# Altium footprint library mornsun_footprint.PcbLib: 11 footprints
Each footprint in its own frame and in the unit in brackets; x right, y up, seen from the top. Pads: shape width x height; smd on the part's side, far side on the other; paste and mask are expansions set on the pad; w line width, h text height; cw(c..) or ccw(c..) is an arc to the next point about the centre after c.
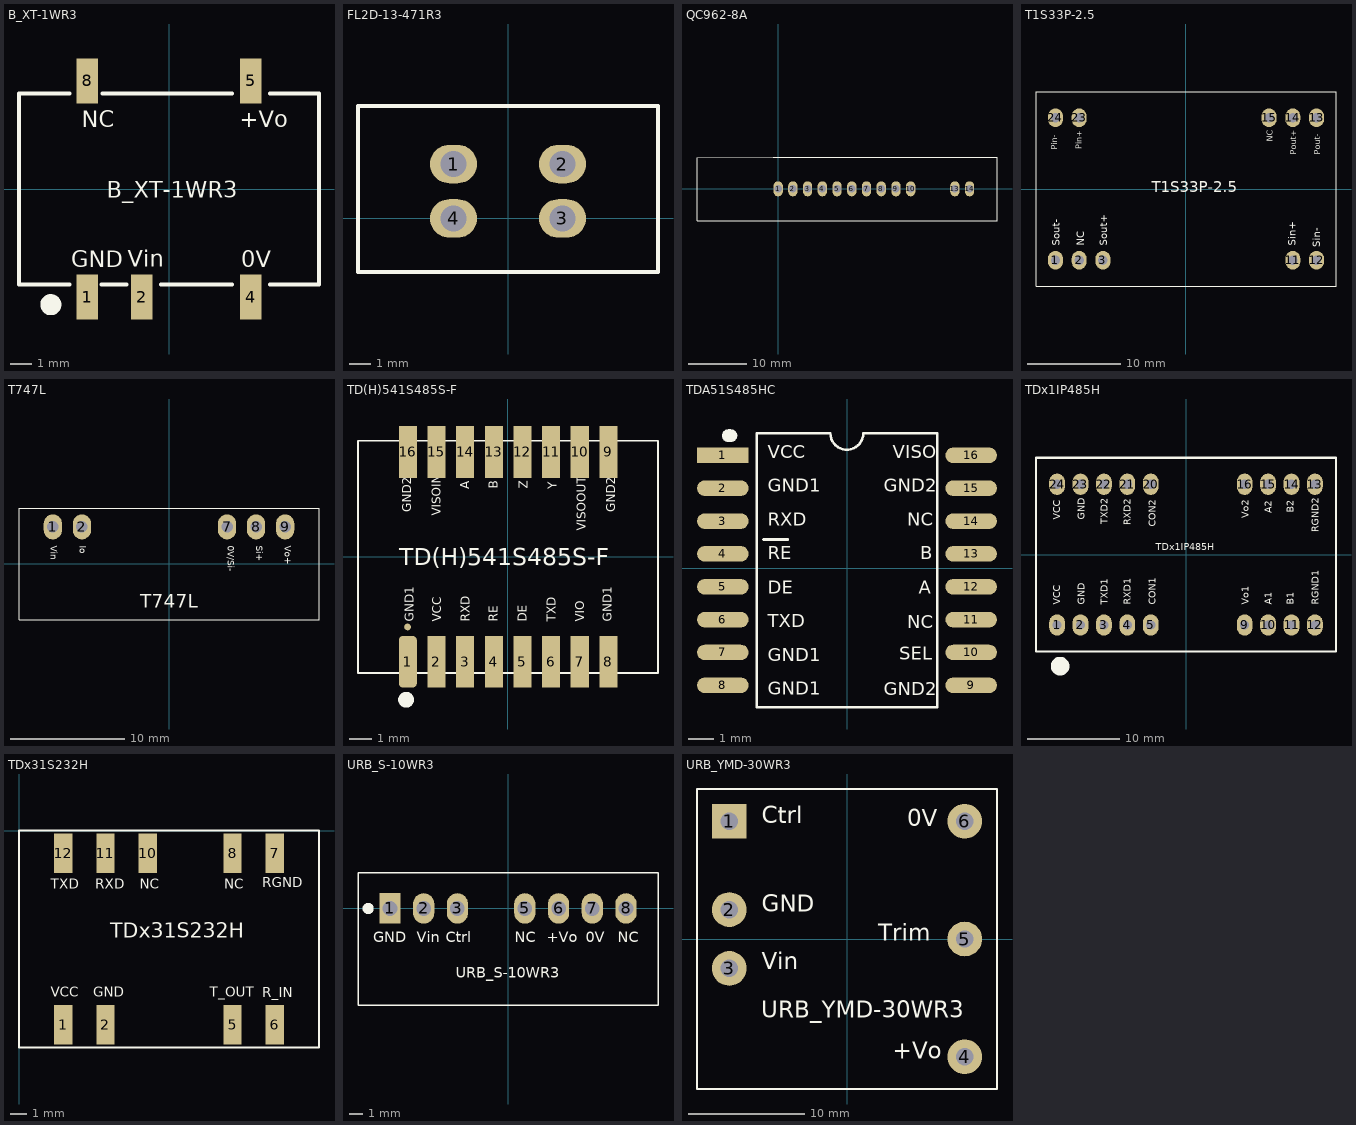
[diagram p0: the footprints below, top view; thin cyan lines are the x and y axes]

## B_XT-1WR3 [mm]
pads (5):
  rect 1x2.1 smd: 1(-3.81,-5.05) 2(-1.27,-5.05) 4(3.81,-5.05) 5(3.81,5.05) 8(-3.81,5.05)
Top Overlay:
  lines w0.178: -4.642,-4.45 -7,-4.45 -7,4.45 -4.642,4.45 ; -3.161,-4.45 -1.981,-4.45 ; -3.099,4.45 -0.38,4.45 2.949,4.45 ; -0.38,-4.45 2.949,-4.45 ; 4.705,-4.45 7,-4.45 7,4.45 4.705,4.45
  lines w0.508: -5.303,-5.295 ccw(c-5.515,-5.401) -5.279,-5.378
  text "B_XT-1WR3" at -2.902,-0.407 h0.76
  text "+Vo" at 3.302,2.878 h0.76
  text "Vin" at -1.925,-3.627 h0.76
  text "NC" at -4.064,2.878 h0.76
  text "GND" at -4.572,-3.646 h0.76
  text "0V" at 3.378,-3.646 h0.76
3D body "B-XT-1WR3.stp": height 7.2, standoff -0.05, extent -6.601,-5.629 6.599,5.771

## FL2D-13-471R3 [mm]
pads (4):
  oval 2.2x1.8 hole 1.2 unplated mask+0.25: 1(-2.54,2.54) 2(2.54,2.54) 3(2.54,0) 4(-2.54,0)
Top Overlay:
  lines w0.2: -7,-2.5 7,-2.5 7,5.25 -5,5.25 -7,5.25 -7,-1.5 -7,-2.5

## QC962-8A [mm]
height 25.5
pads (12):
  oval 1.6x2.6 hole 1.3 mask+0.07: 1(0,0) 2(2.54,0) 3(5.08,0) 4(7.62,0) 5(10.16,0) 6(12.7,0) 7(15.24,0) 8(17.78,0) 9(20.32,0) 10(22.86,0) 13(30.48,0) 14(33.02,0)
Top Overlay:
  lines w0.127: 37.75,5.4 37.75,-5.5 -14,-5.5 -14,5.4 -0.875,5.45 24.875,5.45 37.75,5.45
3D body "QC962-8A.stp": height 3.1, standoff -26, extent -13.6,-5.1 37.4,4.9

## T1S33P-2.5 [mm]
pads (10):
  oval 1.6x2 hole 1 mask+0.102: 1(-13.97,-7.62) 2(-11.43,-7.62) 3(-8.89,-7.62) 11(11.43,-7.62) 12(13.97,-7.62) 13(13.97,7.62) 14(11.43,7.62) 15(8.89,7.62) 23(-11.43,7.62) 24(-13.97,7.62)
Top Overlay:
  lines w0.076: -16.05,-10.4 16.05,-10.4 16.05,10.4 -16.05,10.4 -16.05,-10.4
  text "NC" at 9.286,5.042 h0.64
  text "Pin-" at -13.79,4.182 h0.64
  text "T1S33P-2.5" at -3.683,-0.762 h2
  text "Sin+" at 11.736,-6.067 h0.76
  text "Pout+" at 11.811,3.683 h0.64
  text "Pout-" at 14.351,3.683 h0.64
  text "Pin+" at -11.151,4.243 h0.64
  text "Sout-" at -13.533,-6.07 h0.76
  text "NC" at -10.898,-6.07 h0.76
  text "Sout+" at -8.453,-6.07 h0.76
  text "Sin-" at 14.382,-6.223 h0.76
3D body "TxxxxP.stp": height 9.5, standoff -4.1, extent -15.9,-10.16 15.9,10.14

## T747L [mm]
pads (5):
  oval 1.6x2.2 hole 1 mask+0.102: 1(-10.16,3.25) 2(-7.62,3.25) 7(5.08,3.25) 8(7.62,3.25) 9(10.16,3.25)
Top Overlay:
  lines w0.076: -13.125,-4.875 -13.125,4.875 13.125,4.875 13.125,-4.875 -13.125,-4.875
  text "Vo+" at 9.924,1.603 h1
  text "Si+" at 7.412,1.602 h1
  text "0V/Si-" at 4.9,1.605 h1
  text "Io" at -8.021,1.603 h1
  text "Vin" at -10.585,1.603 h1
  text "T747L" at -2.506,-4.221 h2
3D body "T_L.stp": height 13.01, standoff -3.59, extent -13,-4.699 13,4.801

## TD(H)541S485S-F [mm]
pads (17):
  rrect50% 0.8x2.3 smd mask+0: 1(-4.439,-4.65)
  round 0.3 smd mask+0: 2(-4.451,-3.107)
  rect 0.8x2.3 smd mask+0: 2(-3.169,-4.65) 3(-1.899,-4.65) 4(-0.629,-4.65) 5(0.641,-4.65) 6(1.911,-4.65) 7(3.181,-4.65) 8(4.451,-4.65) 9(4.451,4.65) 10(3.181,4.65) 11(1.911,4.65) 12(0.641,4.65) 13(-0.629,4.65) 14(-1.899,4.65) 15(-3.169,4.65) 16(-4.439,4.65)
Top Overlay:
  circle w0.5: c-4.519,-6.333 r0.098
  lines w0.076: -6.649,-5.15 6.651,-5.15 6.651,5.15 -6.649,5.15 -6.649,-5.15
  text "GND1" at 4.611,-2.88 h0.38
  text "VIO" at 3.377,-2.88 h0.38
  text "TXD" at 2.114,-2.88 h0.38
  text "DE" at 0.828,-2.88 h0.38
  text "RE" at -0.451,-2.88 h0.38
  text "RXD" at -1.7,-2.88 h0.38
  text "VCC" at -2.963,-2.88 h0.38
  text "GND1" at -4.181,-2.88 h0.38
  text "GND2" at 4.755,1.974 h0.38
  text "VISOOUT" at 3.453,1.156 h0.38
  text "Y" at 2.162,2.995 h0.38
  text "Z" at 0.878,3.031 h0.38
  text "B" at -0.45,3.031 h0.38
  text "A" at -1.709,2.995 h0.38
  text "VISOIN" at -2.97,1.814 h0.38
  text "GND2" at -4.28,1.974 h0.38
  text "TD(H)541S485S-F" at -4.824,-0.382 h0.76
3D body "TD541S485S-F.stp": height 3.1, standoff -0.02, extent -6.5,-5.005 6.5,5.005

## TDA51S485HC [mm]
pads (17):
  rect 2x0.6 smd: 1(-4.81,4.36)
  oval 2x0.6 smd: 2(-4.81,3.09) 3(-4.81,1.82) 4(-4.81,0.55) 5(-4.81,-0.72) 6(-4.81,-1.99) 7(-4.81,-3.26) 8(-4.81,-4.53) 9(4.79,-4.53) 10(4.79,-3.26) 11(4.79,-1.99) 12(4.79,-0.72) 13(4.79,0.55) 14(4.79,1.82) 15(4.79,3.09) 16(4.79,4.36)
  oval 0.6x0.5 on Top Overlay mask+0.051: ""(-4.55,5.122)
Top Overlay:
  lines w0.1: -3.497,-5.385 3.477,-5.385 3.477,5.215 0.62,5.215 cw(c-0.015,5.215) -0.65,5.215 -3.497,5.215 -3.497,-5.385
  lines w0.102: -3.238,1.109 -2.301,1.108
  text "VISO" at 1.756,4.251 h0.51
  text "GND2" at 1.406,2.955 h0.51
  text "SEL" at 2.013,-3.549 h0.51
  text "GND2" at 1.406,-4.919 h0.51
  text "NC" at 2.312,-2.329 h0.51
  text "A" at 2.767,-0.982 h0.51
  text "B" at 2.816,0.339 h0.51
  text "NC" at 2.312,1.634 h0.51
  text "RXD" at -3.069,1.634 h0.51
  text "RE" at -3.069,0.339 h0.51
  text "DE" at -3.069,-0.982 h0.51
  text "TXD" at -3.069,-2.277 h0.51
  text "GND1" at -3.069,-4.893 h0.51
  text "GND1" at -3.069,-3.598 h0.51
  text "GND1" at -3.069,2.955 h0.51
  text "VCC" at -3.069,4.251 h0.51

## TDx1IP485H [mm]
pads (18):
  oval 1.7x2.3 hole 1: 1(-13.97,-7.62) 2(-11.43,-7.62) 3(-8.89,-7.62) 4(-6.35,-7.62) 5(-3.81,-7.62) 9(6.35,-7.62) 10(8.89,-7.62) 11(11.43,-7.62) 12(13.97,-7.62) 13(13.97,7.62) 14(11.43,7.62) 15(8.89,7.62) 16(6.35,7.62) 20(-3.81,7.62) 21(-6.35,7.62) 22(-8.89,7.62) 23(-11.43,7.62) 24(-13.97,7.62)
Top Overlay:
  circle w1.1: c-13.637,-12.083 r0.462
  lines w0.254: -16.25,-10.5 -16.25,10.5 16.25,10.5 16.25,-10.5 -16.25,-10.5
  text "VCC" at -13.621,3.758 h0.76
  text "GND" at -10.978,3.794 h0.76
  text "TXD2" at -8.482,3.276 h0.76
  text "RXD2" at -5.961,3.196 h0.76
  text "CON2" at -3.294,2.996 h0.76
  text "RGND2" at 14.359,2.438 h0.76
  text "B2" at 11.692,4.553 h0.76
  text "A2" at 9.298,4.473 h0.76
  text "Vo2" at 6.781,3.914 h0.76
  text "Vo1" at 6.781,-5.456 h0.76
  text "A1" at 9.298,-5.456 h0.76
  text "B1" at 11.692,-5.456 h0.76
  text "RGND1" at 14.359,-5.456 h0.76
  text "CON1" at -3.294,-5.456 h0.76
  text "TDx1IP485H" at -3.259,0.489 h0.76
  text "RXD1" at -5.961,-5.456 h0.76
  text "TXD1" at -8.482,-5.456 h0.76
  text "GND" at -10.978,-5.456 h0.76
  text "VCC" at -13.621,-5.456 h0.76
3D body "TDx1IP485H.stp": height 9.5, standoff -4.1, extent -15.925,-10.15 15.875,10.15

## TDx31S232H [mm]
pads (9):
  rect 1.1x2.35 smd: 1(2.65,-11.645) 2(5.19,-11.645) 5(12.81,-11.645) 6(15.35,-11.645) 7(15.35,-1.355) 8(12.81,-1.355) 10(7.73,-1.355) 11(5.19,-1.355) 12(2.65,-1.355)
Top Overlay:
  lines w0.127: 0,-13 18,-13 18,0 0,0 0,-13
  text "RGND" at 14.605,-3.614 h1
  text "NC" at 12.319,-3.683 h1
  text "NC" at 7.239,-3.683 h1
  text "RXD" at 4.572,-3.683 h1
  text "TXD" at 1.905,-3.683 h1
  text "R_IN" at 14.605,-10.218 h1
  text "T_OUT" at 11.43,-10.16 h1
  text "GND" at 4.445,-10.16 h1
  text "VCC" at 1.905,-10.16 h1
  text "TDx31S232H" at 5.461,-6.731 h1.52
3D body "TDx31S232H.stp": height 9.5, standoff 0.05, extent 0.399,-12.546 17.399,-0.408

## URB_S-10WR3 [mm]
pads (7):
  rect 1.6x2.3 hole 1.1: 1(-8.89,0)
  oval 1.6x2.3 hole 1.1: 2(-6.35,0) 3(-3.81,0) 5(1.27,0) 6(3.81,0) 7(6.35,0) 8(8.89,0)
Top Overlay:
  circle w0.6: c-10.531,0 r0.117
  lines w0.1: -11.3,-7.3 -11.3,2.7 11.3,2.7 11.3,-7.3 -11.3,-7.3
  text "Vin" at -6.858,-2.54 h0.8
  text "GND" at -10.16,-2.54 h0.8
  text "+Vo" at 2.921,-2.54 h0.8
  text "0V" at 5.842,-2.54 h0.8
  text "NC" at 0.508,-2.54 h0.8
  text "URB_S-10WR3" at -3.937,-5.207 h0.8
  text "Ctrl" at -4.699,-2.54 h0.8
  text "NC" at 8.255,-2.54 h0.8
3D body "URB_S-10WR3.stp": height 12, standoff -4.1, extent -11,-7.036 11,2.464

## URB_YMD-30WR3 [mm]
pads (6):
  rect 3x3 hole 1.5: 1(-10.16,10.16)
  round 3 hole 1.5: 2(-10.16,2.54) 3(-10.16,-2.54) 4(10.16,-10.16) 5(10.16,0) 6(10.16,10.16)
Top Overlay:
  lines w0.2: -12.95,-12.95 12.95,-12.95 12.95,12.95 -12.95,12.95 -12.95,-12.95
  text "Trim" at 2.719,-0.673 h2.5
  text "Ctrl" at -7.365,9.454 h2.5
  text "URB_YMD-30WR3" at -7.4,-7.3 h2.5
  text "GND" at -7.365,1.854 h2.5
  text "Vin" at -7.367,-3.146 h2.5
  text "+Vo" at 3.959,-10.873 h2.5
  text "0V" at 5.19,9.227 h2.5
3D body "URB_YMD-30WR3.stp": height 12.7, standoff -3.15, extent -12.7,-12.8 12.7,12.65